# Altium footprint library DrPCB.PcbLib: 910 footprints (part 54 of 57)
Each footprint in its own frame and in the unit in brackets; x right, y up, seen from the top. Pads: shape width x height; smd on the part's side, far side on the other; paste and mask are expansions set on the pad; w line width, h text height; cw(c..) or ccw(c..) is an arc to the next point about the centre after c.
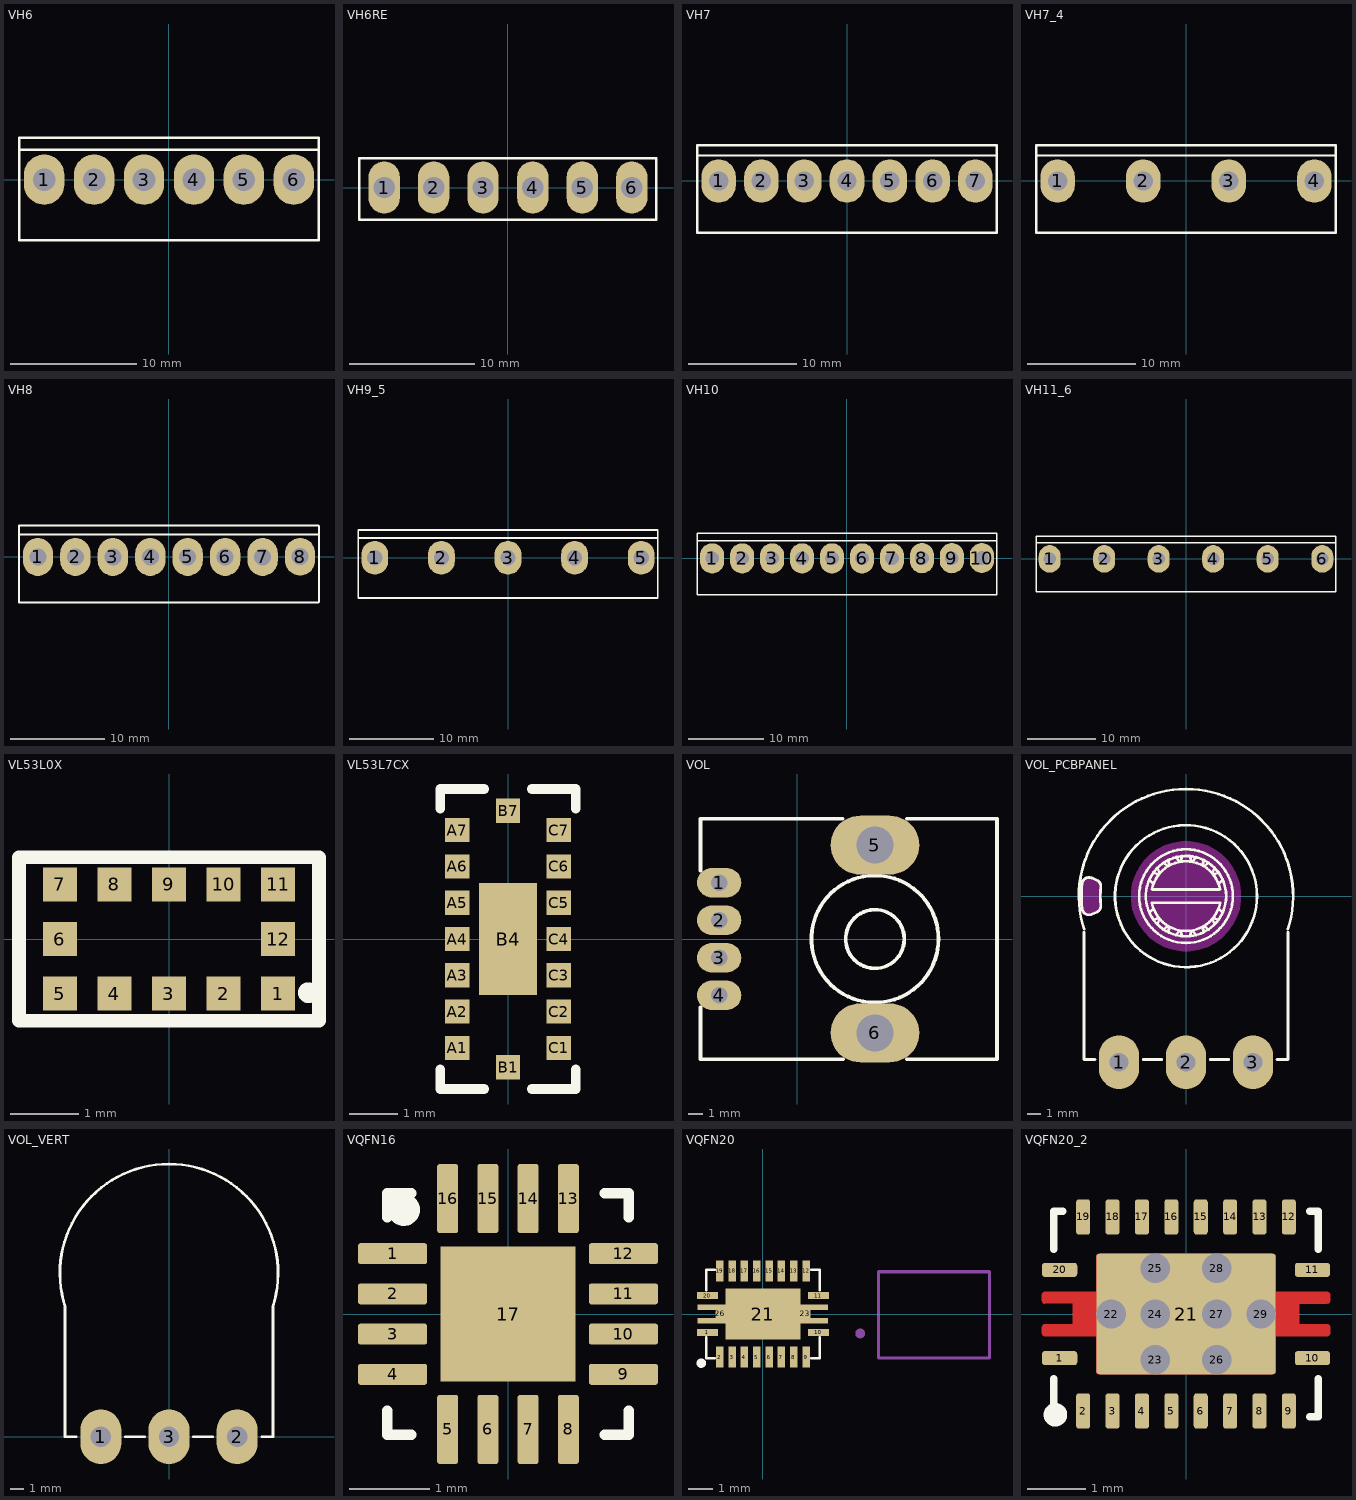
[diagram p53: the footprints below, top view; thin cyan lines are the x and y axes]

## VH6 [mm]
pads (6):
  oval 3.2x4 hole 1.8: 1(-9.912,0) 2(-5.947,0) 3(-1.982,0) 4(1.983,0) 5(5.947,0) 6(9.912,0)
Top Overlay:
  lines w0.2: -11.894,2.363 11.877,2.362 ; 11.89,-4.8 -11.894,-4.8 -11.894,3.315 11.899,3.315 11.899,-4.8
3D body "User Library-user_library-b6p-vh_asm.STEP": height 10.9, standoff -3.7, extent -11.775,-4.618 11.655,3.882

## VH6RE [mm]
pads (6):
  oval 2.5x4.2 hole 1.7: 1(-9.914,0) 2(-5.954,0) 3(-1.994,0) 4(1.984,0) 5(5.949,0) 6(9.914,0)
Top Overlay:
  lines w0.2: -11.896,2.324 -11.896,-2.6 11.889,-2.6 11.889,2.363 -11.896,2.363
3D body "User Library-B3PS-VH.STEP": height 4.75, standoff -7.65, extent -11.864,-14.824 -0.044,0.646
3D body "User Library-B5PS-VH.STEP": height 4.75, standoff -7.65, extent -7.886,-14.824 11.854,0.646

## VH7 [mm]
pads (7):
  oval 3.2x4 hole 1.8: 1(-11.895,0) 2(-7.93,0) 3(-3.965,0) 4(0,0) 5(3.965,0) 6(7.93,0) 7(11.895,0)
Top Overlay:
  lines w0.2: -13.876,2.363 13.87,2.362 ; 13.87,-4.8 -13.876,-4.8 -13.876,3.315 13.882,3.315 ; 13.879,-4.8 13.879,3.267
3D body "User Library-JST B7P-VH.STEP": height 10.9, standoff -3.7, extent -13.829,-4.801 13.831,3.699

## VH7_4 [mm]
pads (4):
  oval 3.2x4 hole 1.8: 1(-11.895,0) 2(-3.965,0) 3(3.965,0) 4(11.895,0)
Top Overlay:
  lines w0.2: -13.876,2.363 13.87,2.362 ; 13.87,-4.8 -13.876,-4.8 -13.876,3.315 13.882,3.315 ; 13.879,-4.8 13.879,3.267
3D body "B7.STEP": height 10.9, standoff -3.7, extent -13.83,-4.801 13.83,3.699

## VH8 [mm]
pads (8):
  oval 3.2x4 hole 1.8: 1(-13.877,-0.013) 2(-9.912,-0.013) 3(-5.947,-0.013) 4(-1.982,-0.013) 5(1.983,-0.013) 6(5.947,-0.013) 7(9.912,-0.013) 8(13.877,0.013)
Top Overlay:
  lines w0.2: -15.859,2.35 15.824,2.349 ; 15.85,-4.813 -15.859,-4.813 -15.859,3.302 15.837,3.302 15.859,3.28 15.859,-4.787
3D body "User Library-B8P-VH.STEP": height 10.9, standoff -3.7, extent -15.81,-4.648 15.81,3.852

## VH9_5 [mm]
pads (5):
  oval 3.2x4 hole 1.8: 1(-15.857,0) 2(-7.929,0) 3(0,0) 4(7.929,0) 5(15.857,0)
Top Overlay:
  lines w0.2: -17.839,2.363 17.832,2.361 ; -17.839,-4.8 17.845,-4.8 17.845,3.315 -17.839,3.315 -17.839,-4.8
3D body "User Library-B9P-VH2.STEP": height 10.9, standoff -3.7, extent -17.79,-4.623 17.79,3.877

## VH10 [mm]
pads (10):
  oval 3.2x4 hole 1.8: 1(-17.84,-0.025) 2(-13.875,-0.025) 3(-9.91,-0.025) 4(-5.945,-0.025) 5(-1.98,-0.025) 6(1.985,-0.025) 7(5.95,-0.025) 8(9.915,0) 9(13.875,0) 10(17.84,0.025)
Top Overlay:
  lines w0.2: -19.821,2.337 19.812,2.336 ; -19.821,-4.825 -19.821,3.289 19.821,3.289 19.821,-4.825 -19.821,-4.825
3D body "User Library-B10P-VH.STEP": height 10.9, standoff -3.7, extent -19.77,-4.585 19.77,3.915

## VH11_6 [mm]
pads (6):
  oval 3.2x4 hole 1.8: 1(-19.826,0) 2(-11.897,0) 3(-3.969,0) 4(3.96,0) 5(11.889,0) 6(19.826,0)
Top Overlay:
  lines w0.2: -21.807,2.363 21.8,2.361 ; 21.774,-4.8 -21.807,-4.8 -21.807,3.315 21.8,3.315 ; 21.814,-4.8 21.814,3.315
3D body "x9396wv-11-46sn.STEP": height 10.31, standoff -2.99, extent -21.78,-4.423 21.78,4.017

## VL53L0X [mm]
pads (12):
  rect 0.5x0.5 smd: 1(1.6,-0.8) 2(0.8,-0.8) 3(0,-0.8) 4(-0.8,-0.8) 5(-1.6,-0.8) 6(-1.6,0) 7(-1.6,0.8) 8(-0.8,0.8) 9(0,0.8) 10(0.8,0.8) 11(1.6,0.8) 12(1.6,0)
Top Overlay:
  circle w0.254: c2.045,-0.787 r0.025
  lines w0.2: -2.2,-1.2 2.2,-1.2 ; -2.2,-1.181 -2.2,1.2 2.2,1.2 2.2,-1.181

## VL53L7CX [mm]
pads (17):
  rect 0.5x0.5 smd: A1(-1.05,-2.25) A2(-1.05,-1.5) A3(-1.05,-0.75) A4(-1.05,0) A5(-1.05,0.75) A6(-1.05,1.5) A7(-1.05,2.25) B1(0,-2.65) B7(0,2.65) C1(1.05,-2.25) C2(1.05,-1.5) C3(1.05,-0.75) C4(1.05,0) C5(1.05,0.75) C6(1.05,1.5) C7(1.05,2.25)
  rect 1.2x2.316 smd: B4(0,0)
Top Overlay:
  lines w0.2: -1.4,-2.695 -1.4,-3.1 -0.494,-3.1 ; -1.4,2.695 -1.4,3.1 -0.494,3.1 ; 0.494,-3.1 1.4,-3.1 1.4,-2.695 ; 0.494,3.1 1.4,3.1 1.4,2.695

## VOL [mm]
pads (6):
  oval 3x2 hole 1.1: 1(-5.271,3.81) 2(-5.271,1.27) 3(-5.271,-1.27) 4(-5.271,-3.81)
  oval 6x4 hole 2.5: 5(5.271,6.35) 6(5.271,-6.35)
Top Overlay:
  circle w0.254: c5.271,0 r1.984
  circle w0.254: c5.271,0 r4.297
  lines w0.2: 13.525,-8.128 13.525,8.128
  lines w0.254: -6.54,-4.623 -6.54,-8.128 3.124,-8.128 ; -6.54,4.635 -6.54,8.128 3.086,8.128 ; 7.429,-8.128 13.525,-8.128 13.525,8.128 7.442,8.128

## VOL_PCBPANEL [mm] "VOULME VERTICAL"
height 0.508
pads (3):
  oval 3x4 hole 1.4: 1(-5,-12.4) 2(0,-12.4) 3(5,-12.4)
Top Overlay:
  circle w0.2: c0,0 r5.3
  circle w0.2: c0,0 r3.5
  circle w0.2: c0,0 r3
  lines w0.2: -7.742,-0.987 ccw(c-7.25,-0.9) -7.049,-1.358 -6.582,-1.15 ; -7.742,0.987 cw(c-7.25,0.9) -7.049,1.358 -6.582,1.15 ; -7.738,-0.978 cw(c0,0) -7.737,0.986 ; -7.62,-2.7 -7.62,-12.2 -6.8,-12.2 ; -7.608,-2.472 cw(c0,0) 7.608,-2.472 ; -6.584,-1.147 ccw(c-6.865,-0.734) -6.366,-0.708 ; -6.584,1.147 cw(c-6.865,0.734) -6.366,0.708 ; -6.361,-0.707 cw(c0,0) -6.361,0.707 ; -3.2,-12.2 -1.8,-12.2 ; -2.748,-1.24 -2.452,-0.954 ; -2.748,1.24 -2.452,0.954 ; -2.55,-0.51 ccw(c0,0) 2.55,-0.51 ; -2.55,0.51 cw(c0,0) 2.55,0.51 ; -2.5,-0.5 2.5,-0.5 ; -2.5,0.5 2.5,0.5 ; -2.448,-1.76 -2.052,-1.646 ; -2.448,1.76 -2.052,1.646 ; -2.158,-2.105 -1.978,-1.735 ; -2.158,2.105 -1.978,1.735 ; -1.699,-2.491 -1.365,-2.249 ; -1.699,2.491 -1.365,2.249 ; -1.308,-2.716 -1.265,-2.306 ; -1.308,2.716 -1.265,2.306 ; -0.744,-2.922 -0.513,-2.58 ; -0.744,2.922 -0.513,2.58 ; -0.4,-2.6 -0.3,-3 ; -0.4,2.6 -0.3,3 ; 0.3,-3 0.4,-2.6 ; 0.3,3 0.4,2.6 ; 0.513,-2.58 0.744,-2.922 ; 0.513,2.58 0.744,2.922 ; 1.265,-2.306 1.308,-2.716 ; 1.265,2.306 1.308,2.716 ; 1.365,-2.249 1.699,-2.491 ; 1.365,2.249 1.699,2.491 ; 1.8,-12.2 3.2,-12.2 ; 1.978,-1.735 2.158,-2.105 ; 1.978,1.735 2.158,2.105 ; 2.052,-1.646 2.448,-1.76 ; 2.052,1.646 2.448,1.76 ; 2.452,-0.954 2.748,-1.24 ; 2.452,0.954 2.748,1.24 ; 6.8,-12.2 7.62,-12.2 7.62,-2.7
Keep-Out Layer:
  board cut-out: 4.1,0 4.1,-0.323 3.999,-0.96 3.8,-1.574 3.507,-2.149 3.128,-2.671 2.671,-3.128 2.149,-3.507 1.574,-3.8 0.96,-3.999 0.323,-4.1 -0.323,-4.1 -0.96,-3.999 -1.574,-3.8 -2.149,-3.507 -2.671,-3.128 -3.128,-2.671 -3.507,-2.149 -3.8,-1.574 -3.999,-0.96 -4.1,-0.323 -4.1,0.323 -3.999,0.96 -3.8,1.574 -3.507,2.149 -3.128,2.671 -2.671,3.128 -2.149,3.507 -1.574,3.8 -0.96,3.999 -0.323,4.1 0.323,4.1 0.96,3.999 1.574,3.8 2.149,3.507 2.671,3.128 3.128,2.671 3.507,2.149 3.8,1.574 3.999,0.96 4.1,0.323
  board cut-out: -7.742,-0.987 -7.733,-1.043 -7.688,-1.147 -7.622,-1.239 -7.536,-1.314 -7.436,-1.368 -7.326,-1.397 -7.213,-1.402 -7.101,-1.381 -7.049,-1.358 -6.582,-1.15 -6.584,-1.147 -6.53,-1.111 -6.446,-1.014 -6.388,-0.898 -6.362,-0.772 -6.366,-0.708 -6.361,-0.707 -6.378,-0.531 -6.398,-0.177 -6.398,0.177 -6.378,0.531 -6.361,0.707 -6.366,0.708 -6.362,0.772 -6.388,0.898 -6.446,1.014 -6.53,1.111 -6.584,1.147 -6.582,1.15 -7.049,1.358 -7.101,1.381 -7.213,1.402 -7.326,1.397 -7.436,1.368 -7.536,1.314 -7.622,1.239 -7.688,1.147 -7.733,1.043 -7.742,0.987 -7.737,0.986 -7.769,0.741 -7.802,0.247 -7.803,-0.248 -7.773,-0.741
Keep-Out Layer:
  lines w0.2: -7.742,-0.987 ccw(c-7.25,-0.9) -7.049,-1.358 -6.582,-1.15 ; -7.742,0.987 cw(c-7.25,0.9) -7.049,1.358 -6.582,1.15 ; -7.738,-0.978 cw(c0,0) -7.737,0.986 ; -6.584,-1.147 ccw(c-6.865,-0.734) -6.366,-0.708 ; -6.584,1.147 cw(c-6.865,0.734) -6.366,0.708 ; -6.361,-0.707 cw(c0,0) -6.361,0.707 ; 4,0 ccw(c0,0) 4,0
3D body "Standard Potentiometer - Vertical (No Value).STEP": height 10.77, standoff -15.23, extent -8.575,-12.65 8.625,8.6

## VOL_VERT [mm] "VOULME VERTICAL"
height 0.508
pads (3):
  oval 3x4 hole 1.5: 1(-5,0) 2(5,0) 3(0,0)
Top Overlay:
  lines w0.2: -7.62,9.5 -7.62,0 -6.8,0 ; -7.608,9.528 cw(c0,12) 7.608,9.528 ; -3.2,0 -1.8,0 ; 1.8,0 3.2,0 ; 6.8,0 7.62,0 7.62,9.5
3D body "Standard Potentiometer - Vertical (No Value).STEP": height 24.26, standoff -1.74, extent -8.564,-0.338 8.636,20.912

## VQFN16 [mm]
pads (17):
  rrect25% 0.86x0.26 smd paste-0.04: 1(-1.435,0.75) 2(-1.435,0.25) 3(-1.435,-0.25) 4(-1.435,-0.75) 9(1.435,-0.75) 10(1.435,-0.25) 11(1.435,0.25) 12(1.435,0.75)
  rrect25% 0.26x0.86 smd paste-0.04: 5(-0.75,-1.435) 6(-0.25,-1.435) 7(0.25,-1.435) 8(0.75,-1.435) 13(0.75,1.435) 14(0.25,1.435) 15(-0.25,1.435) 16(-0.75,1.435)
  rect 1.68x1.68 smd paste-2: 17(0,0)
Top Overlay:
  circle w0.2: c-1.295,1.295 r0.1
  lines w0.127: -1.5,-1.2 -1.5,-1.5 -1.2,-1.5 ; -1.5,1.2 -1.5,1.5 -1.2,1.5 ; 1.2,-1.5 1.5,-1.5 1.5,-1.2 ; 1.2,1.5 1.5,1.5 1.5,1.2
Top Paste:
  region: 0.53,-0.53 -0.53,-0.53 -0.53,0.53 0.53,0.53
3D body "step_temp.STEP": height 1, standoff 0, extent -1.5,-1.5 1.5,1.5

## VQFN20 [mm]
pads (27):
  rect 0.85x0.3 smd: 1(-2.25,-0.75) 10(2.25,-0.75) 11(2.25,0.75) 20(-2.25,0.75)
  rect 0.3x0.85 smd: 2(-1.75,-1.75) 3(-1.25,-1.75) 4(-0.75,-1.75) 5(-0.25,-1.75) 6(0.25,-1.75) 7(0.75,-1.75) 8(1.25,-1.75) 9(1.75,-1.75) 12(1.75,1.75) 13(1.25,1.75) 14(0.75,1.75) 15(0.25,1.75) 16(-0.25,1.75) 17(-0.75,1.75) 18(-1.25,1.75) 19(-1.75,1.75)
  rect 3.05x2.05 smd: 21(0,0)
  rect 1.125x0.23 smd: 22(2.088,0.275) 24(2.088,-0.275) 25(-2.087,0.275) 27(-2.087,-0.275)
  rect 0.4x0.7 smd: 23(1.725,0.006) 26(-1.725,0.006)
Top Overlay:
  circle w0.254: c-2.502,-1.994 r0.064
  lines w0.1: -2.3,-0.953 -2.3,-1.8 -1.956,-1.8 ; -2.3,0.956 -2.3,1.803 -1.956,1.803 ; 1.956,-1.8 2.3,-1.8 2.3,-0.953 ; 1.956,1.803 2.3,1.803 2.3,0.956
Top Paste:
  region: -2.632,0.39 -1.725,0.39 -1.725,0.16 -2.632,0.16
  region: -2.63,-0.16 -1.725,-0.16 -1.725,-0.391 -2.63,-0.391
  region: 1.731,-0.16 2.625,-0.16 2.625,-0.391 1.731,-0.391
  region: 1.729,0.39 2.625,0.39 2.625,0.16 1.729,0.16
  region: -1.474,0.97 -0.15,0.97 -0.15,0.15 -1.474,0.15
  region: 0.15,-0.15 1.47,-0.15 1.47,-0.972 0.15,-0.972
  region: -1.473,-0.15 -0.15,-0.15 -0.15,-0.972 -1.473,-0.972
  region: 0.15,0.97 1.47,0.97 1.47,0.15 0.15,0.15
Top Solder:
  drawing of 1 lines, arcs and shapes, not listed
Mechanical 13:
  circle w0.2: c3.947,-0.788 r0.1
  lines w0.127: 4.697,-1.788 9.197,-1.788 9.197,1.712 4.697,1.712 4.697,-1.788
3D body "TPS61088RHLT--3DModel-STEP-56544.STEP": height 1.01, standoff 0.01, extent -2.25,-1.75 2.25,1.75

## VQFN20_2 [mm]
pads (29):
  rrect42% 0.6x0.24 smd paste-1 mask+0.102: 1(-2.15,-0.75) 10(2.15,-0.75) 11(2.15,0.75) 20(-2.15,0.75)
  rrect42% 0.24x0.6 smd paste-1 mask+0.102: 2(-1.75,-1.65) 3(-1.25,-1.65) 4(-0.75,-1.65) 5(-0.25,-1.65) 6(0.25,-1.65) 7(0.75,-1.65) 8(1.25,-1.65) 9(1.75,-1.65) 13(1.25,1.65) 14(0.75,1.65) 15(0.25,1.65) 16(-0.25,1.65) 17(-0.75,1.65) 18(-1.25,1.65) 19(-1.75,1.65)
  rrect42% 0.24x0.6 smd paste-1: 12(1.75,1.65)
  rrect5% 3.05x2.05 smd paste-3: 21(0,0)
  round 0.3 hole 0.5: 22(-1.275,0) 23(-0.525,-0.775) 24(-0.525,0) 25(-0.525,0.775) 26(0.525,-0.775) 27(0.525,0) 28(0.525,0.775) 29(1.275,0)
Top Layer:
  region: 380 vertices and 0 holes, not listed, extent -2.45,-1.025 2.45,1.025
Top Overlay:
  circle w0.2: c-2.222,-1.714 r0.1
  lines w0.127: -2.25,-1.1 -2.25,-1.75 -2.1,-1.75 ; -2.25,1.1 -2.25,1.75 -2.1,1.75 ; 2.1,-1.75 2.25,-1.75 2.25,-1.1 ; 2.1,1.75 2.25,1.75 2.25,1.1
Top Paste:
  region: -1.95,-0.85 -1.95,-0.65 -2.35,-0.65 -2.35,-0.85
  region: -1.95,0.65 -1.95,0.85 -2.35,0.85 -2.35,0.65
  region: 2.35,0.65 2.35,0.85 1.95,0.85 1.95,0.65
  region: 2.35,-0.85 2.35,-0.65 1.95,-0.65 1.95,-0.85
  rectangle: 1.65,-1.85 1.85,-1.45
  rectangle: -1.85,-1.85 -1.65,-1.45
  rectangle: -1.35,-1.85 -1.15,-1.45
  rectangle: -0.85,-1.85 -0.65,-1.45
  rectangle: -0.35,-1.85 -0.15,-1.45
  rectangle: 0.15,-1.85 0.35,-1.45
  rectangle: 0.65,-1.85 0.85,-1.45
  rectangle: 1.15,-1.85 1.35,-1.45
  rectangle: 1.15,1.45 1.35,1.85
  rectangle: 0.65,1.45 0.85,1.85
  rectangle: 0.15,1.45 0.35,1.85
  rectangle: -0.35,1.45 -0.15,1.85
  rectangle: -0.85,1.45 -0.65,1.85
  rectangle: -1.35,1.45 -1.15,1.85
  rectangle: -1.85,1.45 -1.65,1.85
  rectangle: 1.65,1.45 1.85,1.85
  region: 2.349,-0.378 2.349,-0.178 1.95,-0.178 1.95,-0.378
  region: 2.349,0.178 2.349,0.378 1.95,0.378 1.95,0.178
  region: -1.95,-0.378 -1.95,-0.178 -2.349,-0.178 -2.349,-0.378
  region: -1.95,0.178 -1.95,0.378 -2.349,0.378 -2.349,0.178
  region: -0.75,0.86 -0.75,0.26 -1.35,0.26 -1.35,0.86
  region: 0.3,0.86 0.3,0.26 -0.3,0.26 -0.3,0.86
  region: 1.35,0.86 1.35,0.26 0.75,0.26 0.75,0.86
  region: -0.75,-0.26 -0.75,-0.86 -1.35,-0.86 -1.35,-0.26
  region: 0.3,-0.26 0.3,-0.86 -0.3,-0.86 -0.3,-0.26
  region: 1.35,-0.26 1.35,-0.86 0.75,-0.86 0.75,-0.26
Top Solder:
  drawing of 1 lines, arcs and shapes, not listed
3D body "User Library-VQFN-20-2.step": height 1.01, standoff 0.01, extent -2.26,-1.76 2.26,1.76